# Altium schematic symbol library Schlib.SchLib: 725 symbols (part 3 of 6) (continued)
## GRM155R71H152KA01D
designator C?  value 1.5nF  (hidden comment: *)
Multilayer Ceramic Capacitors MLCC Surface Mount 0402 1500pF 50 Volts X7R 10%; Manufacturer: Murata; Manufacturer Part Number: GRM155R71H152KA01D; Supplier: Digikey; Supplier Part Number: 490-3245-1-ND; RoHS: Yes; Category: Ceramic Capacitors; Stock: 306108; Pricing: 1=0.1, 10=0.024, 50=0.0136, 100=0.0105, 500=0.00794, 1000=0.00623, 2500=0.00566, 5000=0.00521 (USD); Lead Free: 5697LeadFree; ComponentLink1URL: https://datasheet.ciiva.com/129/grm155r71h152ka01-01-129756.pdf?src-supplier=Digikey; ComponentLink1Description: https://datasheet.ciiva.com/129/grm155r71h152ka01-01-129756.pdf?src-supplier=Digikey; ComponentLink2URL: https://datasheet.ciiva.com/129/grm155r71h152ka01-01-129757.pdf?src-supplier=Digikey; ComponentLink2Description: https://datasheet.ciiva.com/129/grm155r71h152ka01-01-129757.pdf?src-supplier=Digikey; ComponentLink3URL: https://datasheet.ciiva.com/129/grm155r71h152ka01-01-129758.pdf?src-supplier=Digikey; ComponentLink3Description: https://datasheet.ciiva.com/129/grm155r71h152ka01-01-129758.pdf?src-supplier=Digikey; ComponentLink4URL: https://datasheet.ciiva.com/19476/1856441-19476519.pdf?src-supplier=Jameco; ComponentLink4Description: https://datasheet.ciiva.com/19476/1856441-19476519.pdf?src-supplier=Jameco; ComponentLink5URL: https://datasheet.ciiva.com/18184/getdatasheetpartid-153042-18184727.pdf?src-supplier=Verical; ComponentLink5Description: https://datasheet.ciiva.com/18184/getdatasheetpartid-153042-18184727.pdf?src-supplier=Verical; ComponentLink6URL: https://datasheet.ciiva.com/29199/454238-da-01-en-vs-kondensator-0402-29199743.pdf?src-supplier=Conrad; ComponentLink6Description: https://datasheet.ciiva.com/29199/454238-da-01-en-vs-kondensator-0402-29199743.pdf?src-supplier=Conrad; ComponentLink7URL: https://datasheet.ciiva.com/14116/grmseries-highdielectrictype-eng-14116907.pdf?src-supplier=Distrelec; ComponentLink7Description: https://datasheet.ciiva.com/14116/grmseries-highdielectrictype-eng-14116907.pdf?src-supplier=Distrelec; ComponentLink8URL: https://datasheet.ciiva.com/14116/grmseries-highdielectrictype-eng-14116846.pdf?src-supplier=Distrelec; ComponentLink8Description: https://datasheet.ciiva.com/14116/grmseries-highdielectrictype-eng-14116846.pdf?src-supplier=Distrelec; ComponentLink9URL: https://datasheet.ciiva.com/2989/product-2989403.pdf?src-supplier=Avnet; ComponentLink9Description: https://datasheet.ciiva.com/2989/product-2989403.pdf?src-supplier=Avnet; ComponentLink10URL: https://datasheet.ciiva.com/16199/product-16199179.pdf?src-supplier=Future+Electronics; ComponentLink10Description: https://datasheet.ciiva.com/16199/product-16199179.pdf?src-supplier=Future+Electronics; ComponentLink11URL: https://datasheet.ciiva.com/22698/608985-22698421.pdf?src-supplier=Element14; ComponentLink11Description: https://datasheet.ciiva.com/22698/608985-22698421.pdf?src-supplier=Element14; ComponentLink12URL: https://datasheet.ciiva.com/7937/608985-7937626.pdf?src-supplier=Element14; ComponentLink12Description: https://datasheet.ciiva.com/7937/608985-7937626.pdf?src-supplier=Element14; Case/Package: 0402
footprint C 0402 (1005 Metric) (Chip Capacitor, Body 1.0x0.5mm, IPC High Density)
pins: 1 B, 2 A

## GRM158R61A226ME15D
designator C?  value 22uF  (hidden comment: *)
Ceramic Capacitor, Multilayer, Ceramic, 10V, 20% +Tol, 20% -Tol, X5R, 15% TC, 22uF, Surface Mount, 0402; Manufacturer: Murata; Manufacturer Part Number: GRM158R61A226ME15D; Material: 4241ConductorMaterial; Dielectric: 1537DielectricType; Supplier: Rs; Supplier Part Number: 2763747; RoHS: Yes; Category: Ceramic Capacitors; Stock: 14420; Pricing: 10=0.244, 100=0.216, 500=0.168, 1000=0.13 (EUR); Case/Package: 0402; Min Operating Temperature: -55°C; Max Operating Temperature: 85°C; Tolerance: 20%; Voltage Rating: 10V; Voltage Rating (DC): 10V; Length: 1mm; Width: 500um; Height: 800um; Thickness: 800um
footprint C 0402 (1005 Metric) (Chip Capacitor, Body 1.0x0.5mm, IPC High Density)
pins: 1 B, 2 A

## GRM187R61A226ME15J
designator C?  value 22uF  (hidden comment: *)
Cap Ceramic Monolithic 22uF 10VDC 20% SMD Paper T/R; Manufacturer: Murata; Manufacturer Part Number: GRM187R61A226ME15J; Temperature Coefficient: X5R; Supplier: Digi-Key; Supplier Part Number: 490-GRM187R61A226ME15JCT-ND; RoHS: Yes; Category: Ceramic Capacitors; Stock: 22450; Pricing: 1=0.35000, 10=0.24600, 50=0.17220, 100=0.14760, 500=0.11068, 1000=0.09346, 2500=0.08854, 5000=0.08362 (USD); RoHS Compliant: Yes; Case/Package: 0603
footprint C 0603 (1608 Metric)
pins: 1 B, 2 A

## GRM188C81A106MA73D
designator C?  value 10µF  (hidden comment: *)
10V 10uF X6S ±20% 0603 Multilayer Ceramic Capacitors MLCC - SMD/SMT ROHS; Manufacturer: Murata; Manufacturer Part Number: GRM188C81A106MA73D; Manufacturer Lifecycle Status: IN PRODUCTION; Supplier: Arrow Electronics; Supplier Part Number: GRM188C81A106MA73D; RoHS: Compliant; Category: Ceramic Capacitors; Stock: 15369; Pricing: 1642=0.0461, 3000=0.045, 6000=0.045, 15000=0.044 (USD); Case/Package: 0603; Case Code (Imperial): 0603; Case Code (Metric): 1608; Dielectric: X6S; Dielectric Material: Ceramic; Height: 800µm; Lead Free: Lead Free; Length: 1.6mm; Lifecycle Status: Production; Material: Ceramic; Max Operating Temperature: 105°C; Min Operating Temperature: -55°C; Mounting Technology: Surface Mount; Number of Terminals: 2; REACH SVHC: Yes; Schedule B: 8532240020, 8532240020|8532240020, 8532240020|8532240020|8532240020, 8532240020|8532240020|8532240020|8532240020; Thickness: 800µm; Tolerance: 20%; Voltage Rating: 10V; Voltage Rating (DC): 10V; Width: 800µm; ComponentLink1URL: https://datasheet.octopart.com:443/GRM188C81A106MA73D-Murata-datasheet-141274651.pdf?src-supplier=Future+Electronics; ComponentLink1Description: https://datasheet.octopart.com:443/GRM188C81A106MA73D-Murata-datasheet-141274651.pdf?src-supplier=Future+Electronics; ComponentLink2URL: https://datasheet.octopart.com:443/GRM188C81A106MA73D-Murata-datasheet-96971104.pdf?src-supplier=Future+Electronics; ComponentLink2Description: https://datasheet.octopart.com:443/GRM188C81A106MA73D-Murata-datasheet-96971104.pdf?src-supplier=Future+Electronics; ComponentLink3URL: https://datasheet.octopart.com:443/GRM188C81A106MA73D-Murata-datasheet-22122223.pdf?src-supplier=Future+Electronics; ComponentLink3Description: https://datasheet.octopart.com:443/GRM188C81A106MA73D-Murata-datasheet-22122223.pdf?src-supplier=Future+Electronics; ComponentLink4URL: https://datasheet.octopart.com:443/GRM188C81A106MA73D-Murata-datasheet-149523171.pdf?src-supplier=Farnell; ComponentLink4Description: https://datasheet.octopart.com:443/GRM188C81A106MA73D-Murata-datasheet-149523171.pdf?src-supplier=Farnell; ComponentLink5URL: https://datasheet.octopart.com:443/GRM188C81A106MA73D-Murata-datasheet-66077086.pdf?src-supplier=element14+APAC; ComponentLink5Description: https://datasheet.octopart.com:443/GRM188C81A106MA73D-Murata-datasheet-66077086.pdf?src-supplier=element14+APAC; ComponentLink6URL: https://datasheet.octopart.com:443/GRM188C81A106MA73D-Murata-datasheet-165579666.pdf?src-supplier=TME; ComponentLink6Description: https://datasheet.octopart.com:443/GRM188C81A106MA73D-Murata-datasheet-165579666.pdf?src-supplier=TME; ComponentLink7URL: https://datasheet.octopart.com:443/GRM188C81A106MA73D-Murata-datasheet-140703321.pdf?src-supplier=Ciiva; ComponentLink7Description: https://datasheet.octopart.com:443/GRM188C81A106MA73D-Murata-datasheet-140703321.pdf?src-supplier=Ciiva; ComponentLink8URL: https://datasheet.octopart.com:443/GRM188C81A106MA73D-Murata-datasheet-138742663.pdf?src-supplier=Ciiva; ComponentLink8Description: https://datasheet.octopart.com:443/GRM188C81A106MA73D-Murata-datasheet-138742663.pdf?src-supplier=Ciiva; ComponentLink9URL: https://datasheet.octopart.com/GRM188C81A106MA73D-Murata-datasheet-12515295.pdf; ComponentLink9Description: https://datasheet.octopart.com/GRM188C81A106MA73D-Murata-datasheet-12515295.pdf; ComponentLink10URL: https://datasheet.octopart.com/GRM188C81A106MA73D-Murata-datasheet-12510076.pdf; ComponentLink10Description: https://datasheet.octopart.com/GRM188C81A106MA73D-Murata-datasheet-12510076.pdf; ComponentLink11URL: https://datasheet.octopart.com/GRM188C81A106MA73D-Murata-datasheet-11978611.pdf; ComponentLink11Description: https://datasheet.octopart.com/GRM188C81A106MA73D-Murata-datasheet-11978611.pdf; ComponentLink12URL: https://datasheet.octopart.com/GRM188C81A106MA73D-Murata-datasheet-10025737.pdf; ComponentLink12Description: https://datasheet.octopart.com/GRM188C81A106MA73D-Murata-datasheet-10025737.pdf; ComponentLink13URL: https://datasheet.octopart.com/GRM188C81A106MA73D-Murata-datasheet-8819587.pdf; ComponentLink13Description: https://datasheet.octopart.com/GRM188C81A106MA73D-Murata-datasheet-8819587.pdf; ComponentLink14URL: https://datasheet.octopart.com/GRM188C81A106MA73D-Murata-datasheet-14400899.pdf; ComponentLink14Description: https://datasheet.octopart.com/GRM188C81A106MA73D-Murata-datasheet-14400899.pdf; ComponentLink15URL: http://sigma.octopart.com:80/reach_statement/Murata-company-16.pdf?src-supplier=Compliance+Statements; ComponentLink15Description: http://sigma.octopart.com:80/reach_statement/Murata-company-16.pdf?src-supplier=Compliance+Statements
footprint C 0603 (1608 Metric)
pins: 1 B, 2 A

## GRM188R61E106KA73D
designator C?  value 10µF  (hidden comment: *)
Ceramic Capacitor, Ceramic, 25V, 10% +Tol, 10% -Tol, X5R, 15% TC, 10uF, Surface Mount, 0603; Manufacturer: Murata; Manufacturer Part Number: GRM188R61E106KA73D; Manufacturer Lifecycle Status: IN PRODUCTION; Supplier: Arrow Electronics; Supplier Part Number: GRM188R61E106KA73D; RoHS: Compliant; Category: Ceramic Capacitors; Stock: 1240000; Pricing: 4000=0.044, 8000=0.04, 24000=0.036 (USD); Case/Package: 0603; Dielectric: X5R; Dielectric Material: Ceramic; Height: 800µm; Length: 1.6mm; Lifecycle Status: Production; Material: Ceramic; Max Operating Temperature: 85°C; Min Operating Temperature: -55°C; Mounting Technology: Surface Mount; Number of Terminals: 2; REACH SVHC: Yes; Schedule B: 8532240020, 8532240020|8532240020|8532240020|8532240020|8532240020; Thickness: 800µm; Tolerance: 10%; Voltage Rating: 25V; Voltage Rating (DC): 25V; Width: 800µm; ComponentLink1URL: https://datasheet.octopart.com:443/GRM188R61E106KA73D-Murata-datasheet-149523249.pdf?src-supplier=Newark; ComponentLink1Description: https://datasheet.octopart.com:443/GRM188R61E106KA73D-Murata-datasheet-149523249.pdf?src-supplier=Newark; ComponentLink2URL: https://datasheet.octopart.com:443/GRM188R61E106KA73D-Murata-datasheet-165579666.pdf?src-supplier=TME; ComponentLink2Description: https://datasheet.octopart.com:443/GRM188R61E106KA73D-Murata-datasheet-165579666.pdf?src-supplier=TME; ComponentLink3URL: https://datasheet.octopart.com:443/GRM188R61E106KA73D-Murata-datasheet-141274968.pdf?src-supplier=Ciiva; ComponentLink3Description: https://datasheet.octopart.com:443/GRM188R61E106KA73D-Murata-datasheet-141274968.pdf?src-supplier=Ciiva; ComponentLink4URL: https://datasheet.octopart.com:443/GRM188R61E106KA73D-Murata-datasheet-140704821.pdf?src-supplier=Ciiva; ComponentLink4Description: https://datasheet.octopart.com:443/GRM188R61E106KA73D-Murata-datasheet-140704821.pdf?src-supplier=Ciiva; ComponentLink5URL: https://datasheet.octopart.com:443/GRM188R61E106KA73D-Murata-datasheet-138742889.pdf?src-supplier=Ciiva; ComponentLink5Description: https://datasheet.octopart.com:443/GRM188R61E106KA73D-Murata-datasheet-138742889.pdf?src-supplier=Ciiva; ComponentLink6URL: https://datasheet.octopart.com/GRM188R61E106KA73D-Murata-datasheet-12515295.pdf; ComponentLink6Description: https://datasheet.octopart.com/GRM188R61E106KA73D-Murata-datasheet-12515295.pdf; ComponentLink7URL: https://datasheet.octopart.com/GRM188R61E106KA73D-Murata-datasheet-12510076.pdf; ComponentLink7Description: https://datasheet.octopart.com/GRM188R61E106KA73D-Murata-datasheet-12510076.pdf; ComponentLink8URL: https://datasheet.octopart.com/GRM188R61E106KA73D-Murata-datasheet-11978611.pdf; ComponentLink8Description: https://datasheet.octopart.com/GRM188R61E106KA73D-Murata-datasheet-11978611.pdf; ComponentLink9URL: https://datasheet.octopart.com/GRM188R61E106KA73D-Murata-datasheet-10025737.pdf; ComponentLink9Description: https://datasheet.octopart.com/GRM188R61E106KA73D-Murata-datasheet-10025737.pdf; ComponentLink10URL: https://datasheet.octopart.com/GRM188R61E106KA73D-Murata-datasheet-8819587.pdf; ComponentLink10Description: https://datasheet.octopart.com/GRM188R61E106KA73D-Murata-datasheet-8819587.pdf; ComponentLink11URL: http://sigma.octopart.com:80/reach_statement/Murata-company-16.pdf?src-supplier=Compliance+Statements; ComponentLink11Description: http://sigma.octopart.com:80/reach_statement/Murata-company-16.pdf?src-supplier=Compliance+Statements
footprint C 0603 (1608 Metric)
pins: 1 B, 2 A

## GRM188R61H225KE11D
designator C?  value 2.2uF  (hidden comment: *)
Multilayer Ceramic Capacitor, 2.2 uF, 50 V, ± 10%, X5R, 0603 [1608 Metric]; Manufacturer: Murata; Manufacturer Part Number: GRM188R61H225KE11D; Voltage Rating: 50V; Supplier: Mouser; Supplier Part Number: 81-GRM188R61H225KE1D; RoHS: Yes; Category: Ceramic Capacitors; Stock: 344517; Pricing: 1=0.27, 10=0.13, 50=0.13, 100=0.08, 1000=0.062, 10000=0.056 (USD); Mounting Technology: Surface Mount; Case/Package: 0603; Case Code (Metric): 1608; Material: Ceramic; Case Code (Imperial): 0603; Min Operating Temperature: -55°C; Max Operating Temperature: 85°C; Tolerance: 10%; Dielectric: X5R; Packaging: Cut Tape; Series: GRM; Voltage Rating (DC): 50V; Length: 0.063inch; Width: 0.031inch; Height: 0.8mm; Thickness: 0.039inch; Reach SVHC Compliant: No; RoHS Compliant: Yes; ComponentLink1URL: http://www.farnell.com/datasheets/2079169.pdf?src-supplier=Farnell; ComponentLink1Description: http://www.farnell.com/datasheets/2079169.pdf?src-supplier=Farnell; ComponentLink2URL: https://datasheet.octopart.com/GRM188R61H225KE11D-Murata-datasheet-32479577.pdf?src-supplier=Future+Electronics; ComponentLink2Description: https://datasheet.octopart.com/GRM188R61H225KE11D-Murata-datasheet-32479577.pdf?src-supplier=Future+Electronics; ComponentLink3URL: http://www.farnell.com/datasheets/2079169.pdf?src-supplier=Element14; ComponentLink3Description: http://www.farnell.com/datasheets/2079169.pdf?src-supplier=Element14; ComponentLink4URL: https://datasheet.octopart.com/GRM188R61H225KE11D-Murata-datasheet-66077094.pdf?src-supplier=Element14; ComponentLink4Description: https://datasheet.octopart.com/GRM188R61H225KE11D-Murata-datasheet-66077094.pdf?src-supplier=Element14; ComponentLink5URL: https://datasheet.octopart.com/GRM188R61H225KE11D-Murata-datasheet-149523256.pdf?src-supplier=Farnell; ComponentLink5Description: https://datasheet.octopart.com/GRM188R61H225KE11D-Murata-datasheet-149523256.pdf?src-supplier=Farnell; ComponentLink6URL: http://search.murata.co.jp/Ceramy/image/img/A01X/G101/ENG/GRM188R61H225KE11-01.pdf?src-supplier=Digikey; ComponentLink6Description: http://search.murata.co.jp/Ceramy/image/img/A01X/G101/ENG/GRM188R61H225KE11-01.pdf?src-supplier=Digikey; ComponentLink7URL: https://datasheet.octopart.com/GRM188R61H225KE11D-Murata-datasheet-165579666.pdf?src-supplier=TME; ComponentLink7Description: https://datasheet.octopart.com/GRM188R61H225KE11D-Murata-datasheet-165579666.pdf?src-supplier=TME
footprint C 0603 (1608 Metric)
pins: 1 B, 2 A

## GRM188R72A104KA35D
designator C?  value 100nF  (hidden comment: *)
Multilayer Ceramic Capacitor, 0.1 uF, 100 V, ± 10%, X7R, 0603 [1608 Metric]; Manufacturer: Murata; Manufacturer Part Number: GRM188R72A104KA35D; Voltage Rating: 100V; Supplier: Mouser; Supplier Part Number: 81-GRM188R72A104KA35; RoHS: Yes; Category: Ceramic Capacitors; Stock: 936654; Pricing: 1=0.21, 10=0.085, 50=0.085, 100=0.049, 1000=0.043, 10000=0.034 (USD); Mounting Technology: Surface Mount; Case/Package: 0603; Weight: 0.000222oz; Case Code (Imperial): 0603; Case Code (Metric): 1608; Material: Ceramic; Min Operating Temperature: -55°C; Max Operating Temperature: 125°C; Tolerance: 10%; Dielectric: X7R; Voltage Rating (DC): 100V; Packaging: Tape and Reel; Package Quantity: 1; Termination: SMD/SMT; Voltage: 100V; Series: GRM; Construction: Flat; Length: 1.6mm; Width: 0.031inch; Height: 0.8mm; Thickness: 0.035inch; Depth: 0.8mm; Size: 0.8mm; Radiation Hardening: No; Reach SVHC Compliant: No; RoHS Compliant: Yes; Lead Free: 5697LeadFree; ComponentLink1URL: https://datasheet.ciiva.com/18100/getdatasheetpartid-27818-18100710.pdf?src-supplier=Verical; ComponentLink1Description: https://datasheet.ciiva.com/18100/getdatasheetpartid-27818-18100710.pdf?src-supplier=Verical; ComponentLink2URL: https://datasheet.ciiva.com/22703/1747473-22703345.pdf?src-supplier=Element14; ComponentLink2Description: https://datasheet.ciiva.com/22703/1747473-22703345.pdf?src-supplier=Element14; ComponentLink3URL: https://datasheet.ciiva.com/34302/1857815-34302863.pdf?src-supplier=Jameco; ComponentLink3Description: https://datasheet.ciiva.com/34302/1857815-34302863.pdf?src-supplier=Jameco; ComponentLink4URL: https://datasheet.ciiva.com/11787/0900766b80ef921d-11787064.pdf?src-supplier=Rs; ComponentLink4Description: https://datasheet.ciiva.com/11787/0900766b80ef921d-11787064.pdf?src-supplier=Rs; ComponentLink5URL: https://datasheet.ciiva.com/29201/451984-da-01-en-vs-kondensator-0603-29201725.pdf?src-supplier=Conrad; ComponentLink5Description: https://datasheet.ciiva.com/29201/451984-da-01-en-vs-kondensator-0603-29201725.pdf?src-supplier=Conrad; ComponentLink6URL: https://datasheet.ciiva.com/7937/1747473-7937676.pdf?src-supplier=Element14; ComponentLink6Description: https://datasheet.ciiva.com/7937/1747473-7937676.pdf?src-supplier=Element14; ComponentLink7URL: https://datasheet.ciiva.com/135/partnumbering-e-01-135140.pdf?src-supplier=Digikey; ComponentLink7Description: https://datasheet.ciiva.com/135/partnumbering-e-01-135140.pdf?src-supplier=Digikey; ComponentLink8URL: https://datasheet.ciiva.com/135/partnumbering-e-01-135139.pdf?src-supplier=Digikey; ComponentLink8Description: https://datasheet.ciiva.com/135/partnumbering-e-01-135139.pdf?src-supplier=Digikey; ComponentLink9URL: https://datasheet.ciiva.com/135/partnumbering-e-01-135141.pdf?src-supplier=Digikey; ComponentLink9Description: https://datasheet.ciiva.com/135/partnumbering-e-01-135141.pdf?src-supplier=Digikey; ComponentLink10URL: https://datasheet.ciiva.com/16382/product-16382965.pdf?src-supplier=Future+Electronics; ComponentLink10Description: https://datasheet.ciiva.com/16382/product-16382965.pdf?src-supplier=Future+Electronics
footprint C 0603 (1608 Metric)
pins: 1 B, 2 A

## GRM188R72A223JAC4J
designator C?  value 22nF  (hidden comment: *)
Cap 0.022UF 100VDC X7R 5% SMD 0603 Paper Tape; Manufacturer: Murata; Manufacturer Part Number: GRM188R72A223JAC4J; Voltage Rating (DC): 100V; Supplier: Digi-Key; Supplier Part Number: 490-GRM188R72A223JAC4JCT-ND; RoHS: Yes; Category: Ceramic Capacitors; Stock: 7815; Pricing: 1=0.10000, 10=0.06600, 50=0.03580, 100=0.02920, 500=0.02086, 1000=0.01639, 2500=0.01490, 5000=0.01371 (USD); Dielectric: X7R; Tolerance: 5%; Length: 1.6mm; Width: 800um; Thickness: 800um; RoHS Compliant: Yes; Case/Package: 0603
footprint C 0603 (1608 Metric)
pins: 1 B, 2 A

## GRM188Z71A106KA73D
designator C?  value 10uF  (hidden comment: *)
Ceramic Capacitor, Ceramic, 10V, 10% +Tol, 10% -Tol, X7R, 15% TC, 10uF, Surface Mount, 0603; Manufacturer: Murata; Manufacturer Part Number: GRM188Z71A106KA73D; Material: 4241ConductorMaterial; Supplier: Farnell; Supplier Part Number: 3790432; RoHS: Yes; Category: Ceramic Capacitors; Stock: 88746; Pricing: 10=0.158, 100=0.102, 500=0.1, 1000=0.0734, 2000=0.0719 (EUR); Case/Package: 345Case; Min Operating Temperature: -55°C; Max Operating Temperature: 125°C; Tolerance: 10%; Voltage Rating: 10V; Length: 1.6mm; Width: 800um; Height: 1mm; Thickness: 800um; RoHS Compliant: Yes; ComponentLink1URL: https://datasheet.octopart.com/GRM188Z71A106KA73D-Murata-datasheet-165579666.pdf?src-supplier=TME; ComponentLink1Description: https://datasheet.octopart.com/GRM188Z71A106KA73D-Murata-datasheet-165579666.pdf?src-supplier=TME
footprint C 0603 (1608 Metric)
pins: 1 B, 2 A

## GRM188Z71E225ME43D
designator C?  value 2.2uF  (hidden comment: *)
Cap 2.2UF 25VDC X7R 20% SMD 0603 Paper Tape; Manufacturer: Murata; Manufacturer Part Number: GRM188Z71E225ME43D; Supplier: Digi-Key; Supplier Part Number: 490-GRM188Z71E225ME43DCT-ND; RoHS: Yes; Category: Ceramic Capacitors; Stock: 17764; Pricing: 1=0.18000, 10=0.12000, 50=0.07180, 100=0.06060, 500=0.04150, 1000=0.03670 (USD); RoHS Compliant: Yes; Case/Package: 0603
footprint C 0603 (1608 Metric)
pins: 1 B, 2 A

## GRM0335C1E4R7CD01D
designator C?, comment 4.7 pF
4.7 pF ±0.25pF 25V Ceramic Capacitor C0G, NP0 0201 (0603 Metric); Manufacturer Part Number: GRM0335C1E4R7CD01D
footprint CAPC0603X33N
pins: 1, 2

## GRM1555C1H100JA01D
designator C?  value 10pF  (hidden comment: *)
Multilayer Ceramic Capacitor, 10 pF, 50 V, ± 5%, C0G (NP0), 0402 [1005 Metric]; Manufacturer: Murata; Manufacturer Part Number: GRM1555C1H100JA01D; Voltage Rating: 50V; Supplier: Digikey; Supplier Part Number: 490-5921-1-ND; RoHS: Yes; Category: Ceramic Capacitors; Stock: 3601487; Pricing: 1=0.1, 10=0.025, 50=0.0142, 100=0.011, 500=0.0083, 1000=0.00651, 2500=0.00592, 5000=0.00545 (USD); Mounting Technology: Surface Mount; Case/Package: 0402; Case Code (Metric): 1005; Case Code (Imperial): 0402; Material: Ceramic; Min Operating Temperature: -55°C; Max Operating Temperature: 125°C; Dielectric: C0G; Packaging: Tape and Reel; Package Quantity: 1; Voltage Rating (DC): 50V; Termination: SMD/SMT; Series: GRM; Tolerance: 5%; Voltage: 50V; Construction: Flat; Length: 1mm; Width: 0.02inch; Height: 0.5mm; Depth: 0.5mm; Thickness: 0.022inch; Radiation Hardening: No; RoHS Compliant: Yes; Lead Free: Lead Free; Reach SVHC Compliant: No; ComponentLink1URL: https://datasheet.ciiva.com/2989/product-2989280.pdf?src-supplier=Avnet; ComponentLink1Description: https://datasheet.ciiva.com/2989/product-2989280.pdf?src-supplier=Avnet; ComponentLink2URL: https://datasheet.ciiva.com/18184/getdatasheetpartid-307234-18184164.pdf?src-supplier=Verical; ComponentLink2Description: https://datasheet.ciiva.com/18184/getdatasheetpartid-307234-18184164.pdf?src-supplier=Verical; ComponentLink3URL: https://datasheet.ciiva.com/29200/453545-da-01-en-vs-kondensator-0402-29200107.pdf?src-supplier=Conrad; ComponentLink3Description: https://datasheet.ciiva.com/29200/453545-da-01-en-vs-kondensator-0402-29200107.pdf?src-supplier=Conrad; ComponentLink4URL: https://datasheet.ciiva.com/7828/1666664-7828812.pdf?src-supplier=Element14; ComponentLink4Description: https://datasheet.ciiva.com/7828/1666664-7828812.pdf?src-supplier=Element14; ComponentLink5URL: https://datasheet.ciiva.com/6271/partnumbering-e-01-6271159.pdf?src-supplier=Digikey; ComponentLink5Description: https://datasheet.ciiva.com/6271/partnumbering-e-01-6271159.pdf?src-supplier=Digikey; ComponentLink6URL: https://datasheet.ciiva.com/6271/partnumbering-e-01-6271158.pdf?src-supplier=Digikey; ComponentLink6Description: https://datasheet.ciiva.com/6271/partnumbering-e-01-6271158.pdf?src-supplier=Digikey; ComponentLink7URL: https://datasheet.ciiva.com/6271/partnumbering-e-01-6271068.pdf?src-supplier=Digikey; ComponentLink7Description: https://datasheet.ciiva.com/6271/partnumbering-e-01-6271068.pdf?src-supplier=Digikey
footprint C 0402 (1005 Metric) (Chip Capacitor, Body 1.0x0.5mm, IPC High Density)
pins: 1 B, 2 A

## GRM1555C1H101JA01D
designator C?  value 100pF  (hidden comment: *)
0402 100pF 50V ±5 % Tolerance C0G SMT Multilayer Ceramic Capacitor; Manufacturer: Murata; Manufacturer Part Number: GRM1555C1H101JA01D; Tolerance: 5%; Supplier: Farnell; Supplier Part Number: 4326651; RoHS: Yes; Category: Ceramic Capacitors; Stock: 423619; Pricing: 10=0.019, 100=0.0104, 500=0.0081, 2500=0.0057, 5000=0.0056 (EUR); Mounting Technology: Surface Mount; Case/Package: 0402; Case Code (Metric): 1005; Case Code (Imperial): 0402; Material: Ceramic; Min Operating Temperature: -55°C; Max Operating Temperature: 125°C; Voltage Rating: 50V; Packaging: Tape and Reel; Package Quantity: 1; Voltage Rating (DC): 50V; Dielectric: C0G; Termination: SMD/SMT; Voltage: 50V; Series: GRM; Construction: Flat; Length: 1mm; Width: 0.02inch; Height: 0.5mm; Thickness: 0.022inch; Depth: 0.5mm; Radiation Hardening: No; Reach SVHC Compliant: No; Lead Free: Lead Free; RoHS Compliant: Yes; ComponentLink1URL: https://datasheet.ciiva.com/11786/0900766b80ef921d-11786069.pdf?src-supplier=Rs; ComponentLink1Description: https://datasheet.ciiva.com/11786/0900766b80ef921d-11786069.pdf?src-supplier=Rs; ComponentLink2URL: https://datasheet.ciiva.com/18184/getdatasheetpartid-199957-18184175.pdf?src-supplier=Verical; ComponentLink2Description: https://datasheet.ciiva.com/18184/getdatasheetpartid-199957-18184175.pdf?src-supplier=Verical; ComponentLink3URL: https://datasheet.ciiva.com/29200/453557-da-01-en-vs-kondensator-0402-29200111.pdf?src-supplier=Conrad; ComponentLink3Description: https://datasheet.ciiva.com/29200/453557-da-01-en-vs-kondensator-0402-29200111.pdf?src-supplier=Conrad; ComponentLink4URL: https://datasheet.ciiva.com/6271/partnumbering-e-01-6271071.pdf?src-supplier=Digikey; ComponentLink4Description: https://datasheet.ciiva.com/6271/partnumbering-e-01-6271071.pdf?src-supplier=Digikey; ComponentLink5URL: https://datasheet.ciiva.com/16440/product-16440566.pdf?src-supplier=Future+Electronics; ComponentLink5Description: https://datasheet.ciiva.com/16440/product-16440566.pdf?src-supplier=Future+Electronics
footprint C 0402 (1005 Metric) (Chip Capacitor, Body 1.0x0.5mm, IPC High Density)
pins: 1 B, 2 A

## GRM1555C1H391JA01D
designator C?  value 390pF  (hidden comment: *)
Multilayer Ceramic Capacitor, 390 pF, 50 V, ï¿½ 5%, C0G (NP0), 0402 [1005 Metric]; Manufacturer: Murata; Manufacturer Part Number: GRM1555C1H391JA01D; Voltage Rating: 50V; Temperature Coefficient: 30ppm/°C; Supplier: Rs; Supplier Part Number: 2477961; RoHS: Yes; Category: Ceramic Capacitors; Stock: 1900; Pricing: 100=0.009, 500=0.008, 1000=0.007, 5000=0.005 (EUR); Mounting Technology: Surface Mount; Case Code (Metric): 1005; Case Code (Imperial): 0402; Material: Ceramic; Min Operating Temperature: -55°C; Max Operating Temperature: 125°C; Tolerance: 5%; Package Quantity: 1; Packaging: Tape and Reel; Voltage Rating (DC): 50V; Dielectric: C0G; Termination: SMD/SMT; Voltage: 50V; Series: GRM; Construction: Flat; Length: 1mm; Width: 0.02inch; Height: 0.5mm; Thickness: 0.022inch; Depth: 0.5mm; Radiation Hardening: No; Reach SVHC Compliant: No; Lead Free: Lead Free; RoHS Compliant: Yes; ComponentLink1URL: https://datasheet.ciiva.com/11789/0900766b80ef921d-11789181.pdf?src-supplier=Rs; ComponentLink1Description: https://datasheet.ciiva.com/11789/0900766b80ef921d-11789181.pdf?src-supplier=Rs; ComponentLink2URL: https://datasheet.ciiva.com/18184/getdatasheetpartid-178936-18184349.pdf?src-supplier=Verical; ComponentLink2Description: https://datasheet.ciiva.com/18184/getdatasheetpartid-178936-18184349.pdf?src-supplier=Verical; ComponentLink3URL: https://datasheet.ciiva.com/29199/453836-da-01-en-vs-kondensator-0402-29199956.pdf?src-supplier=Conrad; ComponentLink3Description: https://datasheet.ciiva.com/29199/453836-da-01-en-vs-kondensator-0402-29199956.pdf?src-supplier=Conrad; ComponentLink4URL: https://datasheet.ciiva.com/14116/grmseries-tc-hitype-eng-14116895.pdf?src-supplier=Distrelec; ComponentLink4Description: https://datasheet.ciiva.com/14116/grmseries-tc-hitype-eng-14116895.pdf?src-supplier=Distrelec; ComponentLink5URL: https://datasheet.ciiva.com/132/partnumbering-e-01-132246.pdf?src-supplier=Digikey; ComponentLink5Description: https://datasheet.ciiva.com/132/partnumbering-e-01-132246.pdf?src-supplier=Digikey; ComponentLink6URL: https://datasheet.ciiva.com/132/partnumbering-e-01-132245.pdf?src-supplier=Digikey; ComponentLink6Description: https://datasheet.ciiva.com/132/partnumbering-e-01-132245.pdf?src-supplier=Digikey; ComponentLink7URL: https://datasheet.ciiva.com/132/partnumbering-e-01-132247.pdf?src-supplier=Digikey; ComponentLink7Description: https://datasheet.ciiva.com/132/partnumbering-e-01-132247.pdf?src-supplier=Digikey; ComponentLink8URL: https://datasheet.ciiva.com/11463/product-11463851.pdf?src-supplier=Avnet; ComponentLink8Description: https://datasheet.ciiva.com/11463/product-11463851.pdf?src-supplier=Avnet; Case/Package: 0402
footprint C 0402 (1005 Metric) (Chip Capacitor, Body 1.0x0.5mm, IPC High Density)
pins: 1 B, 2 A

## GRM1555C1H392GE01D
designator C?  value 3.9nF  (hidden comment: *)
Cap Ceramic 3900pF 50V C0G 2% SMD 0402 125°C Paper T/R; Manufacturer: Murata; Manufacturer Part Number: GRM1555C1H392GE01D; Supplier: Mouser; Supplier Part Number: 81-GRM1555C1H392GE1D; RoHS: Yes; Category: Ceramic Capacitors; Stock: 17759; Pricing: 1=0.1, 10=0.047, 50=0.047, 100=0.028, 1000=0.02, 10000=0.017 (USD)
footprint C 0402 (1005 Metric) (Chip Capacitor, Body 1.0x0.5mm, IPC High Density)
pins: 1 B, 2 A

## GRM1555C1H681JA01D
designator C?  value 680pF  (hidden comment: *)
Multilayer Ceramic Capacitor, 680 pF, 50 V, ± 5%, C0G (NP0), 0402 [1005 Metric]; Manufacturer: Murata; Manufacturer Part Number: GRM1555C1H681JA01D; Voltage Rating: 50V; Temperature Coefficient: 30ppm/°C; Insulation Resistance: 10GR; Supplier: Mouser; Supplier Part Number: 81-GRM1555C1H681JA1D; RoHS: Yes; Category: Ceramic Capacitors; Stock: 107373; Pricing: 1=0.1, 10=0.03, 50=0.03, 100=0.018, 1000=0.012, 10000=0.008 (USD); Mounting Technology: Surface Mount; Case/Package: 0402; Pins: 2; Case Code (Metric): 1005; Case Code (Imperial): 0402; Material: Ceramic; Dielectric Material: Ceramic; Min Operating Temperature: -55°C; Max Operating Temperature: 125°C; Tolerance: 5%; Dielectric: C0G; Voltage Rating (DC): 50V; Packaging: Tape and Reel; Package Quantity: 1; Termination: SMD/SMT; Voltage: 50V; Series: GRM; Construction: Flat; Length: 1mm; Width: 0.5mm; Height: 0.5mm; Thickness: 0.022inch; Depth: 0.5mm; Radiation Hardening: No; Reach SVHC Compliant: No; Lead Free: Lead Free; RoHS Compliant: Yes; ComponentLink1URL: https://datasheet.ciiva.com/131/product-131972.pdf?src-supplier=Digikey; ComponentLink1Description: https://datasheet.ciiva.com/131/product-131972.pdf?src-supplier=Digikey; ComponentLink2URL: https://datasheet.ciiva.com/131/grm1555c1h681ja01-01-131974.pdf?src-supplier=Digikey; ComponentLink2Description: https://datasheet.ciiva.com/131/grm1555c1h681ja01-01-131974.pdf?src-supplier=Digikey; ComponentLink3URL: https://datasheet.ciiva.com/11786/0900766b807a1cab-11786505.pdf?src-supplier=Rs; ComponentLink3Description: https://datasheet.ciiva.com/11786/0900766b807a1cab-11786505.pdf?src-supplier=Rs; ComponentLink4URL: https://datasheet.ciiva.com/18184/getdatasheetpartid-153035-18184453.pdf?src-supplier=Verical; ComponentLink4Description: https://datasheet.ciiva.com/18184/getdatasheetpartid-153035-18184453.pdf?src-supplier=Verical; ComponentLink5URL: https://datasheet.ciiva.com/29199/453978-da-01-en-vs-kondensator-0402-29199870.pdf?src-supplier=Conrad; ComponentLink5Description: https://datasheet.ciiva.com/29199/453978-da-01-en-vs-kondensator-0402-29199870.pdf?src-supplier=Conrad; ComponentLink6URL: https://datasheet.ciiva.com/14116/grmseries-tc-hitype-eng-14116902.pdf?src-supplier=Distrelec; ComponentLink6Description: https://datasheet.ciiva.com/14116/grmseries-tc-hitype-eng-14116902.pdf?src-supplier=Distrelec; ComponentLink7URL: https://datasheet.ciiva.com/14116/grmseries-tc-hitype-eng-14116841.pdf?src-supplier=Distrelec; ComponentLink7Description: https://datasheet.ciiva.com/14116/grmseries-tc-hitype-eng-14116841.pdf?src-supplier=Distrelec; ComponentLink8URL: https://datasheet.ciiva.com/7828/4360-7828879.pdf?src-supplier=Element14; ComponentLink8Description: https://datasheet.ciiva.com/7828/4360-7828879.pdf?src-supplier=Element14
footprint C 0402 (1005 Metric) (Chip Capacitor, Body 1.0x0.5mm, IPC High Density)
pins: 1 B, 2 A

## GRM1555C2A560JA01D
designator C?  value 56pF  (hidden comment: *)
Multilayer Ceramic Capacitor, 56 pF, 100 V, ± 5%, C0G (NP0), 0402 [1005 Metric]; Manufacturer: Murata; Manufacturer Part Number: GRM1555C2A560JA01D; Voltage Rating: 100V; Supplier: Mouser; Supplier Part Number: 81-GRM1555C2A560JA1D; RoHS: Yes; Category: Ceramic Capacitors; Stock: 34179; Pricing: 1=0.1, 10=0.04, 50=0.04, 100=0.02, 1000=0.015, 10000=0.011 (USD); Mounting Technology: Surface Mount; Case/Package: 0402; Case Code (Metric): 1005; Case Code (Imperial): 0402; Weight: 0.000212oz; Min Operating Temperature: -55°C; Max Operating Temperature: 125°C; Package Quantity: 1; Packaging: Tape and Reel; Tolerance: 5%; Voltage Rating (DC): 100V; Dielectric: C0G; Termination: SMD/SMT; Series: GRM; Length: 0.039inch; Width: 0.02inch; Height: 0.5mm; Thickness: 0.022inch; RoHS Compliant: Yes; ComponentLink1URL: https://datasheet.ciiva.com/18699/partnumbering-e-01-18699449.pdf?src-supplier=Digikey; ComponentLink1Description: https://datasheet.ciiva.com/18699/partnumbering-e-01-18699449.pdf?src-supplier=Digikey; ComponentLink2URL: https://datasheet.ciiva.com/18699/partnumbering-e-01-18699450.pdf?src-supplier=Digikey; ComponentLink2Description: https://datasheet.ciiva.com/18699/partnumbering-e-01-18699450.pdf?src-supplier=Digikey; ComponentLink3URL: https://datasheet.ciiva.com/18699/partnumbering-e-01-18699451.pdf?src-supplier=Digikey; ComponentLink3Description: https://datasheet.ciiva.com/18699/partnumbering-e-01-18699451.pdf?src-supplier=Digikey; ComponentLink4URL: https://datasheet.ciiva.com/24221/c02e-24221132.pdf?src-supplier=Mouser; ComponentLink4Description: https://datasheet.ciiva.com/24221/c02e-24221132.pdf?src-supplier=Mouser
footprint C 0402 (1005 Metric) (Chip Capacitor, Body 1.0x0.5mm, IPC High Density)
pins: 1 B, 2 A

## GRM1885C1H103JA01D
designator C?  value 10nF  (hidden comment: *)
Multilayer Ceramic Capacitor, Grm Series, 0.01 F, 5%, C0g / Np0, 50 V, 0603 [1608 Metric]; Manufacturer: Murata; Manufacturer Part Number: GRM1885C1H103JA01D; Voltage Rating: 50V; Temperature Coefficient: 30ppm/°C; Supplier: Mouser; Supplier Part Number: 81-GRM1885C1H103JA1D; RoHS: Yes; Category: Ceramic Capacitors; Stock: 600472; Pricing: 1=0.17, 10=0.076, 50=0.076, 100=0.044, 1000=0.033, 10000=0.025 (USD); Mounting Technology: Surface Mount; Case/Package: 0603; Case Code (Metric): 1608; Case Code (Imperial): 0603; Material: Ceramic; Min Operating Temperature: -55°C; Max Operating Temperature: 125°C; Packaging: Cut Tape; Package Quantity: 4000; Tolerance: 5%; Voltage Rating (DC): 50V; Dielectric: C0G; Termination: SMD/SMT; Voltage: 50V; Series: GRM; Length: 1.6mm; Width: 0.8mm; Height: 0.8mm; Thickness: 0.035inch; Lead Pitch: 0.5mm; Depth: 0.8mm; Reach SVHC Compliant: No; RoHS Compliant: Yes; Lead Free: 5697LeadFree; ComponentLink1URL: https://datasheet.ciiva.com/41860/partnumbering-e-01-41860759.pdf?src-supplier=Digikey; ComponentLink1Description: https://datasheet.ciiva.com/41860/partnumbering-e-01-41860759.pdf?src-supplier=Digikey
footprint C 0603 (1608 Metric)
pins: 1 B, 2 A

## GRM1885C2A102JA01J
designator C?  value 1000pF  (hidden comment: *)
0603 1000 pF 100 V ±5% Tolerance C0G/NP0 Multilayer Ceramic Capacitor; Manufacturer: Murata; Manufacturer Part Number: GRM1885C2A102JA01J; Supplier: Mouser; Supplier Part Number: 81-GRM1885C2A102JA1J; RoHS: Yes; Category: Ceramic Capacitors; Stock: 7406; Pricing: 1=0.1, 10=0.03, 50=0.03, 100=0.018, 1000=0.014, 10000=0.01 (USD); ComponentLink1URL: https://datasheet.ciiva.com/166/product-166130.pdf?src-supplier=Digi-Key; ComponentLink1Description: https://datasheet.ciiva.com/166/product-166130.pdf?src-supplier=Digi-Key; ComponentLink2URL: https://datasheet.ciiva.com/29540/grm1885c2a102ja01-01-29540423.pdf?src-supplier=Digi-Key; ComponentLink2Description: https://datasheet.ciiva.com/29540/grm1885c2a102ja01-01-29540423.pdf?src-supplier=Digi-Key; ComponentLink3URL: https://datasheet.ciiva.com/29540/grm1885c2a102ja01-01-29540424.pdf?src-supplier=Digi-Key; ComponentLink3Description: https://datasheet.ciiva.com/29540/grm1885c2a102ja01-01-29540424.pdf?src-supplier=Digi-Key; ComponentLink4URL: https://datasheet.ciiva.com/29540/grm1885c2a102ja01-01-29540425.pdf?src-supplier=Digi-Key; ComponentLink4Description: https://datasheet.ciiva.com/29540/grm1885c2a102ja01-01-29540425.pdf?src-supplier=Digi-Key; ComponentLink5URL: https://datasheet.ciiva.com/5423/product-5423321.pdf?src-supplier=Mouser; ComponentLink5Description: https://datasheet.ciiva.com/5423/product-5423321.pdf?src-supplier=Mouser
footprint C 0603 (1608 Metric)
pins: 1 B, 2 A

## GRPB082VWQS-RC
designator J?  (value not drawn)
Conn Header SMD 16POS 1.27MM; Manufacturer: Sullins; Manufacturer Part Number: GRPB082VWQS-RC; Number of Positions: 16; Pitch: 0.05inch; Supplier: Digikey; Supplier Part Number: S9012E-08-ND; RoHS: Yes; Category: Connectors; Stock: 4446; Pricing: 1=1.38, 60=1.03283, 120=0.98358, 540=0.88446, 1020=0.84565, 5040=0.8025 (USD); Mounting Technology: Surface Mount; Case/Package: SMD/SMT; Contact Plating: Gold; Package Quantity: 1; Number of Rows: 2; Packaging: Bulk; Termination: Solder; Contact Type: Male Pin; Row Spacing: 0.05inch; Contact Mating Length: 0.118inch; RoHS Compliant: Yes; ComponentLink1URL: https://datasheet.ciiva.com/726/grpb-2vwqs-rc10958-c-726627.pdf?src-supplier=Digikey; ComponentLink1Description: https://datasheet.ciiva.com/726/grpb-2vwqs-rc10958-c-726627.pdf?src-supplier=Digikey
footprint GRPB082VWQS-RC
pins: 1, 2, 3, 4, 5, 6, 7, 8, 9, 10, 11, 12, 13, 14, 15, 16

## GRPB102VWQP-RC
designator J?  (value not drawn)
GRPB Series Dual Row 20 Position 1.27 mm Pitch Surface Mount Header; Manufacturer: Sullins; Manufacturer Part Number: GRPB102VWQP-RC; Connector Type: Male Pin; Number of Positions: 20; Pitch: 0.05inch; Supplier: Digi-Key; Supplier Part Number: S9013E-10-ND; RoHS: No; Category: Connectors; Stock: 13838; Pricing: 1=1.95000, 10=1.69800, 100=1.51770, 500=1.26472, 1000=1.08405, 5000=1.04390 (USD); Mounting Technology: Surface Mount; Contact Plating: Gold; Package Quantity: 1; Number of Rows: 2; Packaging: Bulk; Termination: Solder; Row Spacing: 0.05inch; Contact Mating Length: 0.118inch; Lead Free: Lead Free; ComponentLink1URL: https://s3.amazonaws.com/catalogspreads-pdf/PAGE94-95%20.050%20MALE%20HDR%20ST%20RA%20SMT.pdf?src-supplier=Digi-Key; ComponentLink1Description: https://s3.amazonaws.com/catalogspreads-pdf/PAGE94-95%20.050%20MALE%20HDR%20ST%20RA%20SMT.pdf?src-supplier=Digi-Key; ComponentLink2URL: http://www.sullinscorp.com/catalogs/71_Page70-71_HEADER_.050_1.27mm_MALE.pdf?src-supplier=Future+Electronics; ComponentLink2Description: http://www.sullinscorp.com/catalogs/71_Page70-71_HEADER_.050_1.27mm_MALE.pdf?src-supplier=Future+Electronics
footprint GRPB102VWQP-RC
pins: 1, 2, 3, 4, 5, 6, 7, 8, 9, 10, 11, 12, 13, 14, 15, 16, 17, 18, 19, 20

## GRPB102VWQS-RC
designator J?  (value not drawn)
Male, 20 C, SMT, .050" CC; 3.00mm Head/5.10mm Tail, Sf Mt; No GP, Nylon 9t, Brass, 105 C; Manufacturer: Sullins; Manufacturer Part Number: GRPB102VWQS-RC; Supplier: Future Electronics; Supplier Part Number: 1009017; RoHS: Yes; Category: Connectors; Stock: 995; Pricing: 1=1.38, 30=1.34, 100=1.31, 300=1.27, 1000=1.21 (USD); ComponentLink1URL: https://datasheet.ciiva.com/726/grpb-2vwqs-rc10958-c-726629.pdf?src-supplier=Digi-Key; ComponentLink1Description: https://datasheet.ciiva.com/726/grpb-2vwqs-rc10958-c-726629.pdf?src-supplier=Digi-Key
footprint GRPB102VWQS-RC
pins: 1, 2, 3, 4, 5, 6, 7, 8, 9, 10, 11, 12, 13, 14, 15, 16, 17, 18, 19, 20

## GRT155C81A225KE13J
designator C?  value 2.2uF  (hidden comment: *)
Multi-Layer Ceramic Capacitor 2.2uF 10VDC X6S 10% 0402 Paper T/R; Manufacturer: Murata; Manufacturer Part Number: GRT155C81A225KE13J; Supplier: Digi-Key; Supplier Part Number: 490-GRT155C81A225KE13JCT-ND; RoHS: No; Category: Ceramic Capacitors; Stock: 27666; Pricing: 1=0.15000, 10=0.10700, 50=0.06040, 100=0.05010, 500=0.03512, 1000=0.02907, 2500=0.02706, 5000=0.02476 (USD); Case/Package: 0402
footprint C 0402 (1005 Metric) (Chip Capacitor, Body 1.0x0.5mm, IPC High Density)
pins: 1 B, 2 A